# Altium schematic symbol library con-molex.SCHLIB: 369 symbols (part 1 of 6)
Pins are listed as number, name and electrical type; pins without a type are passive.

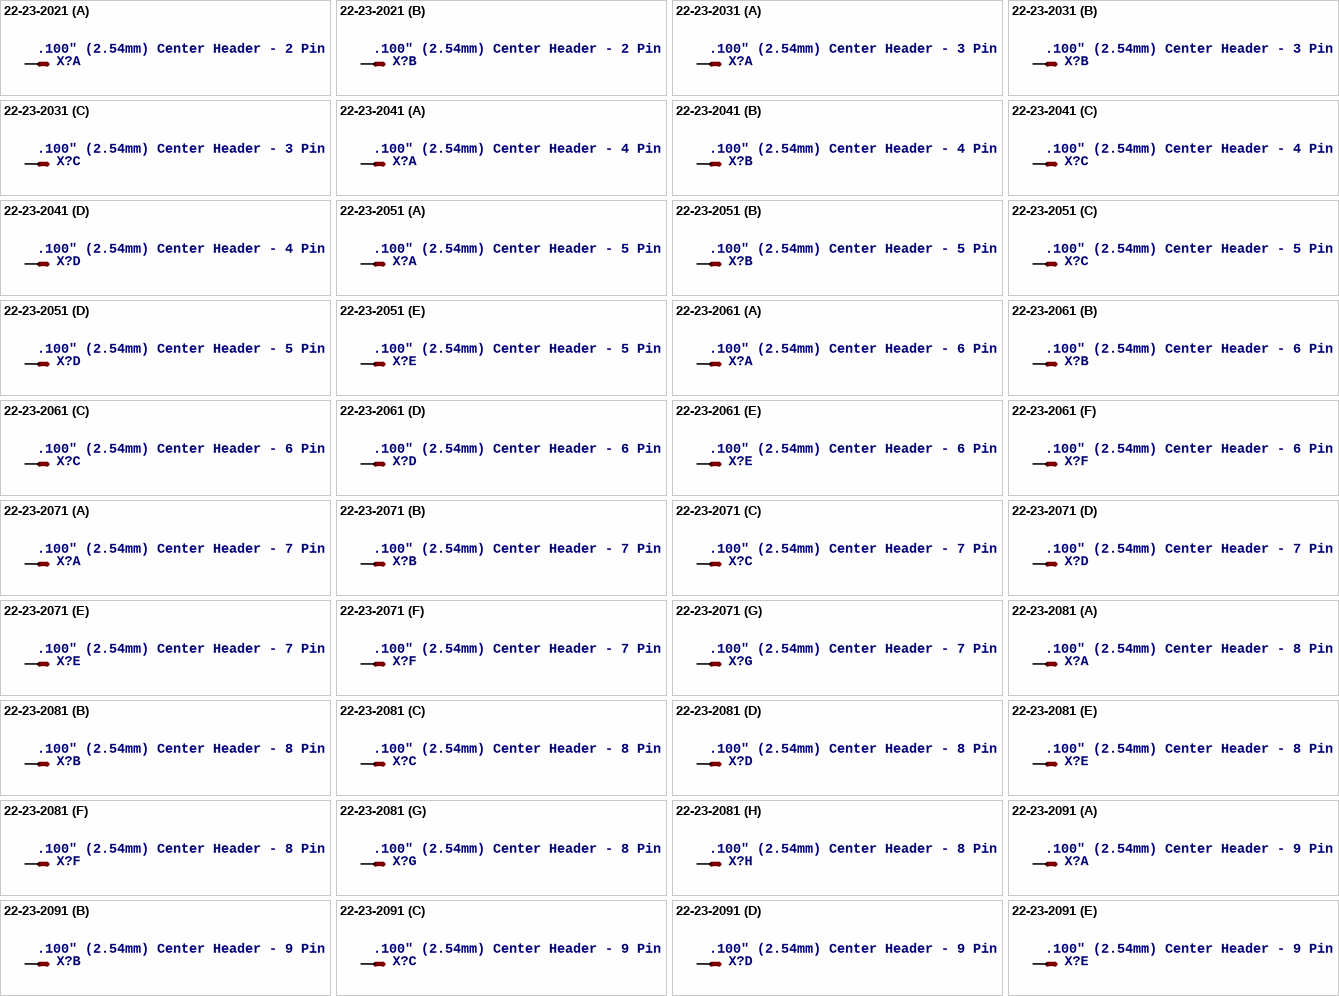
[diagram p0: symbols 22-23-2021 to 22-23-2091]

## 22-23-2021
designator X?, comment .100" (2.54mm) Center Header - 2 Pin
MF: MOLEX; MPN: 22-23-2021; OC_FARNELL: 1462926; OC_NEWARK: 25C3832
footprint 22-23-2021
part A pins: 1 S
part B pins: 2 S

## 22-23-2031
designator X?, comment .100" (2.54mm) Center Header - 3 Pin
MF: MOLEX; MPN: 22-23-2031; OC_FARNELL: 1462950; OC_NEWARK: 30C0862
footprint 22-23-2031
part A pins: 1 S
part B pins: 2 S
part C pins: 3 S

## 22-23-2041
designator X?, comment .100" (2.54mm) Center Header - 4 Pin
MF: MOLEX; MPN: 22-23-2041; OC_FARNELL: 1462920; OC_NEWARK: 38C0355
footprint 22-23-2041
part A pins: 1 S
part B pins: 2 S
part C pins: 3 S
part D pins: 4 S

## 22-23-2051
designator X?, comment .100" (2.54mm) Center Header - 5 Pin
MF: MOLEX; MPN: 22-23-2051; OC_FARNELL: 1462952; OC_NEWARK: 38C9178
footprint 22-23-2051
part A pins: 1 S
part B pins: 2 S
part C pins: 3 S
part D pins: 4 S
part E pins: 5 S

## 22-23-2061
designator X?, comment .100" (2.54mm) Center Header - 6 Pin
MF: MOLEX; MPN: 22-23-2061; OC_FARNELL: 1462922; OC_NEWARK: 27C1933
footprint 22-23-2061
part A pins: 1 S
part B pins: 2 S
part C pins: 3 S
part D pins: 4 S
part E pins: 5 S
part F pins: 6 S

## 22-23-2071
designator X?, comment .100" (2.54mm) Center Header - 7 Pin
MF: MOLEX; MPN: 22-23-2071; OC_FARNELL: 1654534; OC_NEWARK: 56H0445
footprint 22-23-2071
part A pins: 1 S
part B pins: 2 S
part C pins: 3 S
part D pins: 4 S
part E pins: 5 S
part F pins: 6 S
part G pins: 7 S

## 22-23-2081
designator X?, comment .100" (2.54mm) Center Header - 8 Pin
MF: MOLEX; MPN: 22-23-2081; OC_FARNELL: 1756826; OC_NEWARK: 01C7592
footprint 22-23-2081
part A pins: 1 S
part B pins: 2 S
part C pins: 3 S
part D pins: 4 S
part E pins: 5 S
part F pins: 6 S
part G pins: 7 S
part H pins: 8 S

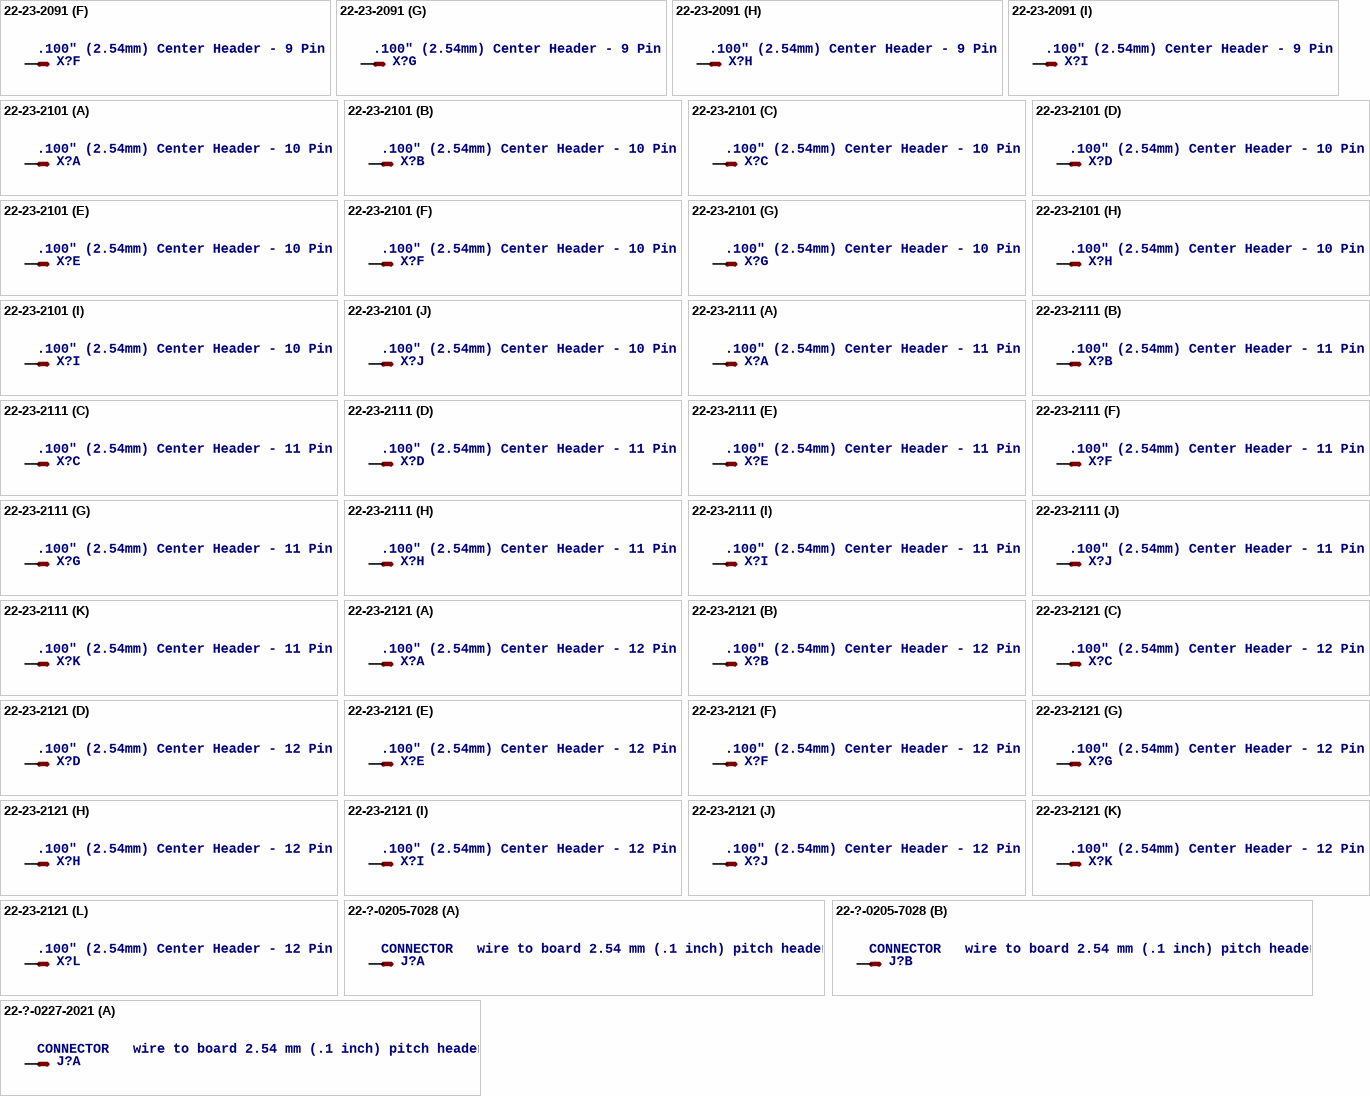
[diagram p1: symbols 22-23-2091 to 22-?-0227-2021]

## 22-23-2091
designator X?, comment .100" (2.54mm) Center Header - 9 Pin
MF: MOLEX; MPN: 22-23-2091; OC_FARNELL: 1756827; OC_NEWARK: 56H0450
footprint 22-23-2091
part A pins: 1 S
part B pins: 2 S
part C pins: 3 S
part D pins: 4 S
part E pins: 5 S
part F pins: 6 S
part G pins: 7 S
part H pins: 8 S
part I pins: 9 S

## 22-23-2101
designator X?, comment .100" (2.54mm) Center Header - 10 Pin
MF: MOLEX; MPN: 22-23-2101; OC_FARNELL: 1756828; OC_NEWARK: 94C0765
footprint 22-23-2101
part A pins: 1 S
part B pins: 2 S
part C pins: 3 S
part D pins: 4 S
part E pins: 5 S
part F pins: 6 S
part G pins: 7 S
part H pins: 8 S
part I pins: 9 S
part J pins: 10 S

## 22-23-2111
designator X?, comment .100" (2.54mm) Center Header - 11 Pin
MF: MOLEX; MPN: 22-23-2111; OC_FARNELL: 5388879; OC_NEWARK: 27C9916
footprint 22-23-2111
part A pins: 1 S
part B pins: 2 S
part C pins: 3 S
part D pins: 4 S
part E pins: 5 S
part F pins: 6 S
part G pins: 7 S
part H pins: 8 S
part I pins: 9 S
part J pins: 10 S
part K pins: 11 S

## 22-23-2121
designator X?, comment .100" (2.54mm) Center Header - 12 Pin
MF: MOLEX; MPN: 22-23-2121; OC_FARNELL: 1462935; OC_NEWARK: 56H0456
footprint 22-23-2121
part A pins: 1 S
part B pins: 2 S
part C pins: 3 S
part D pins: 4 S
part E pins: 5 S
part F pins: 6 S
part G pins: 7 S
part H pins: 8 S
part I pins: 9 S
part J pins: 10 S
part K pins: 11 S
part L pins: 12 S

## 22-?-0205-7028
designator J?, comment CONNECTOR   wire to board 2.54 mm (.1 inch) pitch header
OC_FARNELL: 9731601; OC_NEWARK: unknown
footprint 7395-02
part A pins: 1 S
part B pins: 2 S

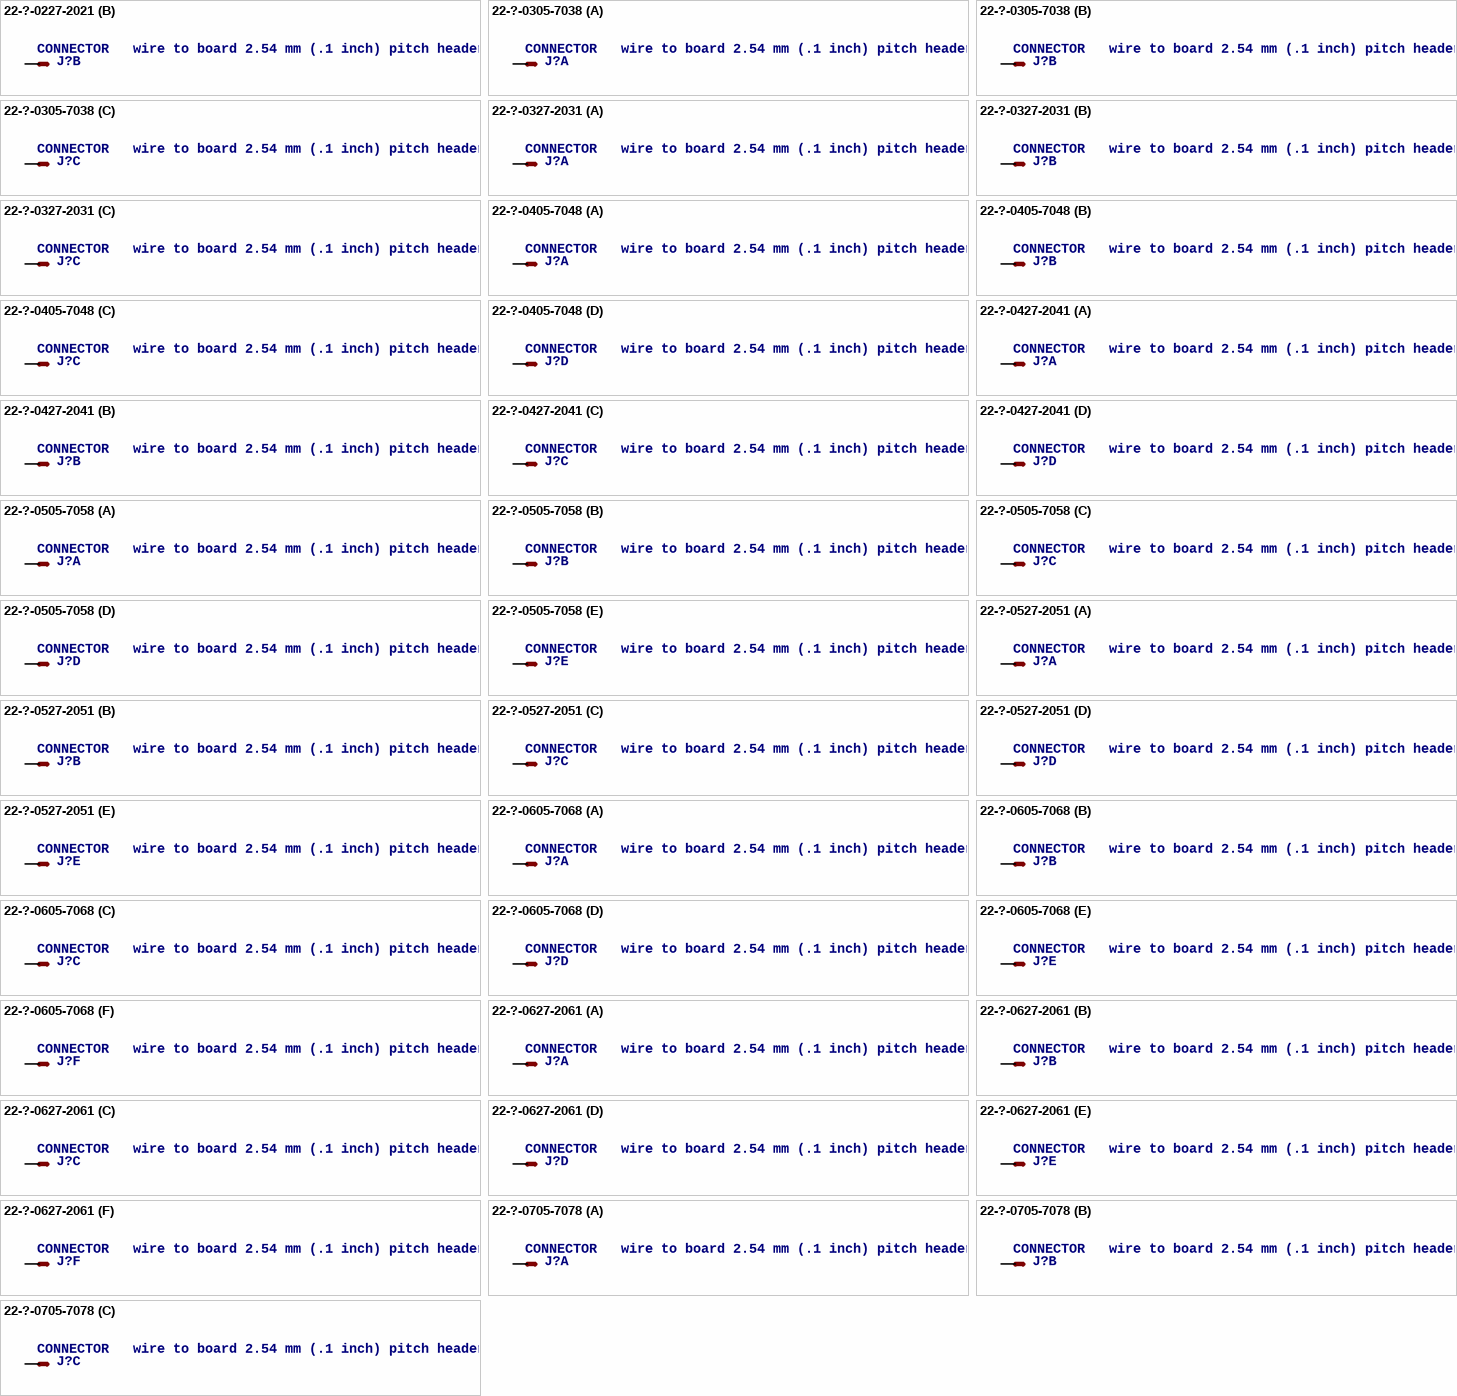
[diagram p2: symbols 22-?-0227-2021 to 22-?-0705-7078]

## 22-?-0227-2021
designator J?, comment CONNECTOR   wire to board 2.54 mm (.1 inch) pitch header
OC_FARNELL: unknown; OC_NEWARK: unknown
footprint 6410-02
part A pins: 1 S
part B pins: 2 S

## 22-?-0305-7038
designator J?, comment CONNECTOR   wire to board 2.54 mm (.1 inch) pitch header
OC_FARNELL: unknown; OC_NEWARK: unknown
footprint 7395-03
part A pins: 1 S
part B pins: 2 S
part C pins: 3 S

## 22-?-0327-2031
designator J?, comment CONNECTOR   wire to board 2.54 mm (.1 inch) pitch header
OC_FARNELL: unknown; OC_NEWARK: unknown
footprint 6410-03
part A pins: 1 S
part B pins: 2 S
part C pins: 3 S

## 22-?-0405-7048
designator J?, comment CONNECTOR   wire to board 2.54 mm (.1 inch) pitch header
OC_FARNELL: unknown; OC_NEWARK: unknown
footprint 7395-04
part A pins: 1 S
part B pins: 2 S
part C pins: 3 S
part D pins: 4 S

## 22-?-0427-2041
designator J?, comment CONNECTOR   wire to board 2.54 mm (.1 inch) pitch header
OC_FARNELL: unknown; OC_NEWARK: unknown
footprint 6410-04
part A pins: 1 S
part B pins: 2 S
part C pins: 3 S
part D pins: 4 S

## 22-?-0505-7058
designator J?, comment CONNECTOR   wire to board 2.54 mm (.1 inch) pitch header
OC_FARNELL: unknown; OC_NEWARK: unknown
footprint 7395-05
part A pins: 1 S
part B pins: 2 S
part C pins: 3 S
part D pins: 4 S
part E pins: 5 S

## 22-?-0527-2051
designator J?, comment CONNECTOR   wire to board 2.54 mm (.1 inch) pitch header
OC_FARNELL: unknown; OC_NEWARK: unknown
footprint 6410-05
part A pins: 1 S
part B pins: 2 S
part C pins: 3 S
part D pins: 4 S
part E pins: 5 S

## 22-?-0605-7068
designator J?, comment CONNECTOR   wire to board 2.54 mm (.1 inch) pitch header
OC_FARNELL: unknown; OC_NEWARK: unknown
footprint 7395-06
part A pins: 1 S
part B pins: 2 S
part C pins: 3 S
part D pins: 4 S
part E pins: 5 S
part F pins: 6 S

## 22-?-0627-2061
designator J?, comment CONNECTOR   wire to board 2.54 mm (.1 inch) pitch header
OC_FARNELL: unknown; OC_NEWARK: unknown
footprint 6410-06
part A pins: 1 S
part B pins: 2 S
part C pins: 3 S
part D pins: 4 S
part E pins: 5 S
part F pins: 6 S

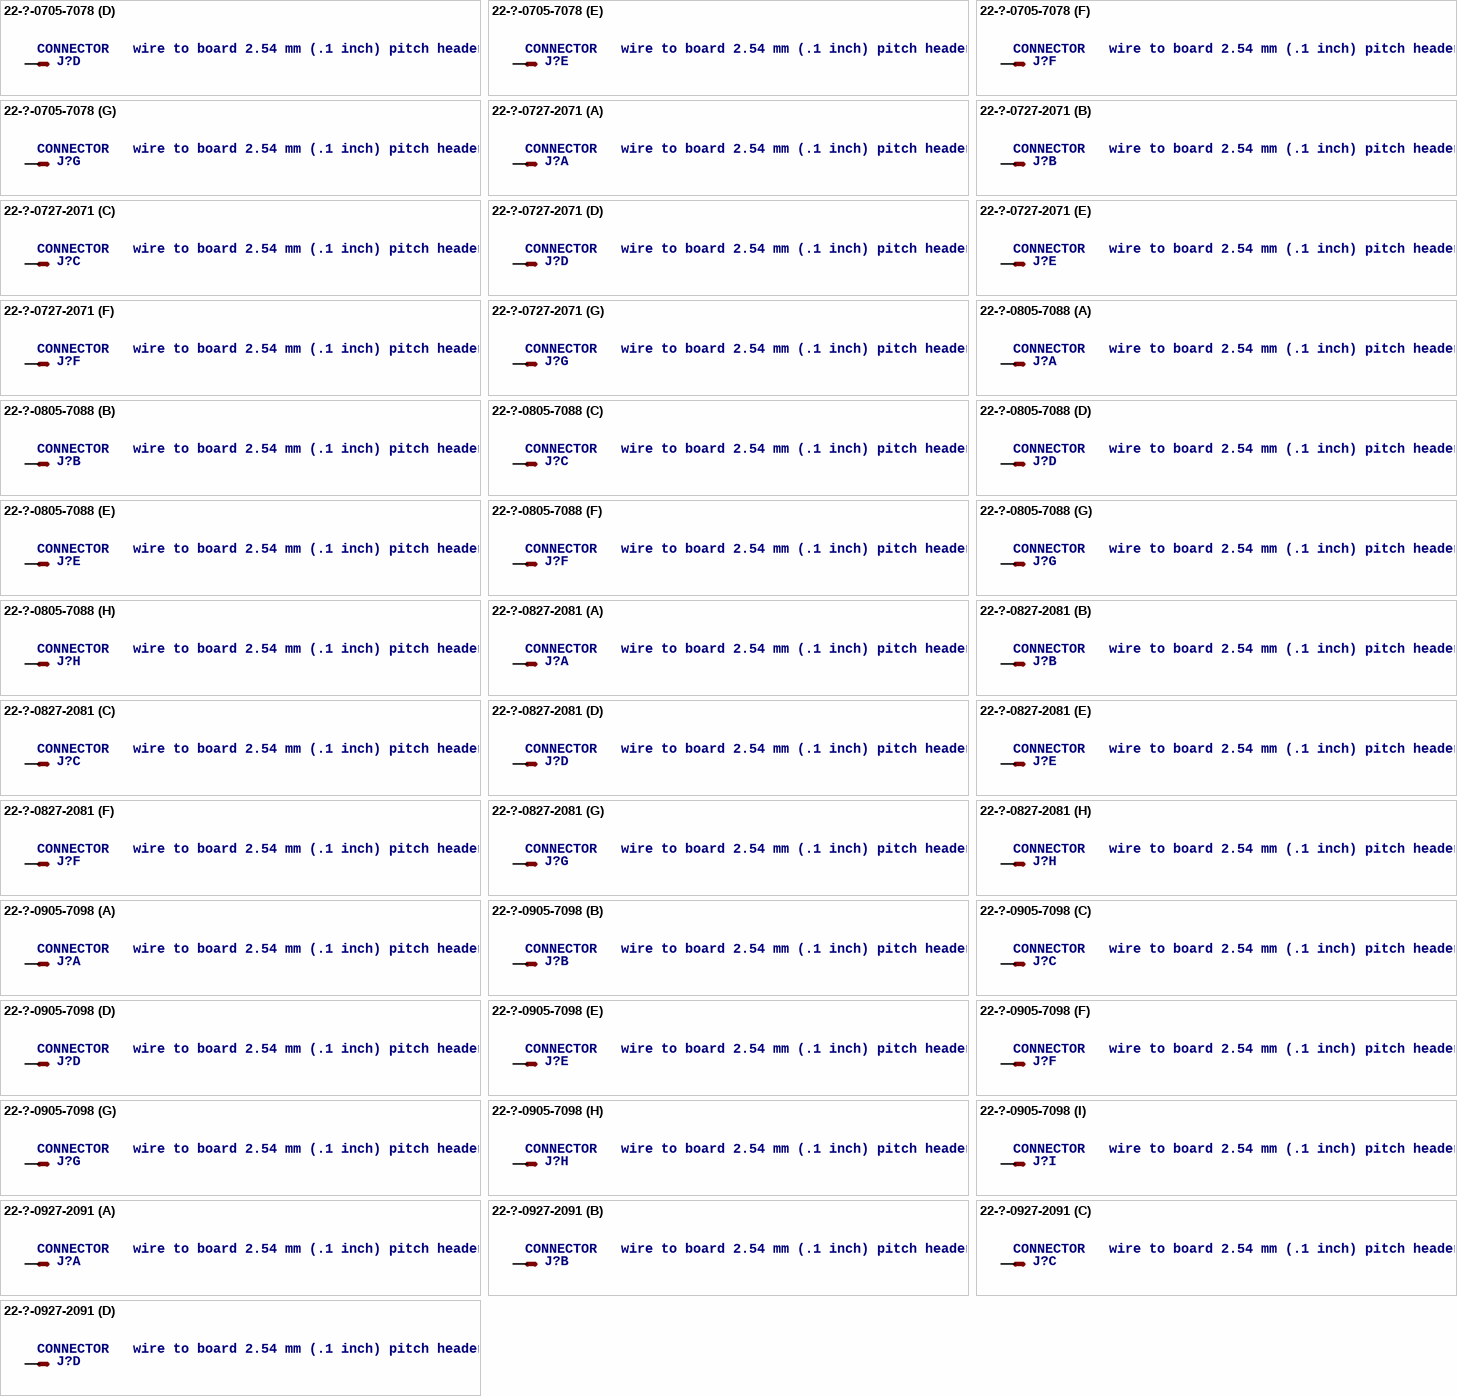
[diagram p3: symbols 22-?-0705-7078 to 22-?-0927-2091]

## 22-?-0705-7078
designator J?, comment CONNECTOR   wire to board 2.54 mm (.1 inch) pitch header
OC_FARNELL: unknown; OC_NEWARK: unknown
footprint 7395-07
part A pins: 1 S
part B pins: 2 S
part C pins: 3 S
part D pins: 4 S
part E pins: 5 S
part F pins: 6 S
part G pins: 7 S

## 22-?-0727-2071
designator J?, comment CONNECTOR   wire to board 2.54 mm (.1 inch) pitch header
OC_FARNELL: unknown; OC_NEWARK: unknown
footprint 6410-07
part A pins: 1 S
part B pins: 2 S
part C pins: 3 S
part D pins: 4 S
part E pins: 5 S
part F pins: 6 S
part G pins: 7 S

## 22-?-0805-7088
designator J?, comment CONNECTOR   wire to board 2.54 mm (.1 inch) pitch header
OC_FARNELL: unknown; OC_NEWARK: unknown
footprint 7395-08
part A pins: 1 S
part B pins: 2 S
part C pins: 3 S
part D pins: 4 S
part E pins: 5 S
part F pins: 6 S
part G pins: 7 S
part H pins: 8 S

## 22-?-0827-2081
designator J?, comment CONNECTOR   wire to board 2.54 mm (.1 inch) pitch header
OC_FARNELL: unknown; OC_NEWARK: unknown
footprint 6410-08
part A pins: 1 S
part B pins: 2 S
part C pins: 3 S
part D pins: 4 S
part E pins: 5 S
part F pins: 6 S
part G pins: 7 S
part H pins: 8 S

## 22-?-0905-7098
designator J?, comment CONNECTOR   wire to board 2.54 mm (.1 inch) pitch header
OC_FARNELL: unknown; OC_NEWARK: unknown
footprint 7395-09
part A pins: 1 S
part B pins: 2 S
part C pins: 3 S
part D pins: 4 S
part E pins: 5 S
part F pins: 6 S
part G pins: 7 S
part H pins: 8 S
part I pins: 9 S

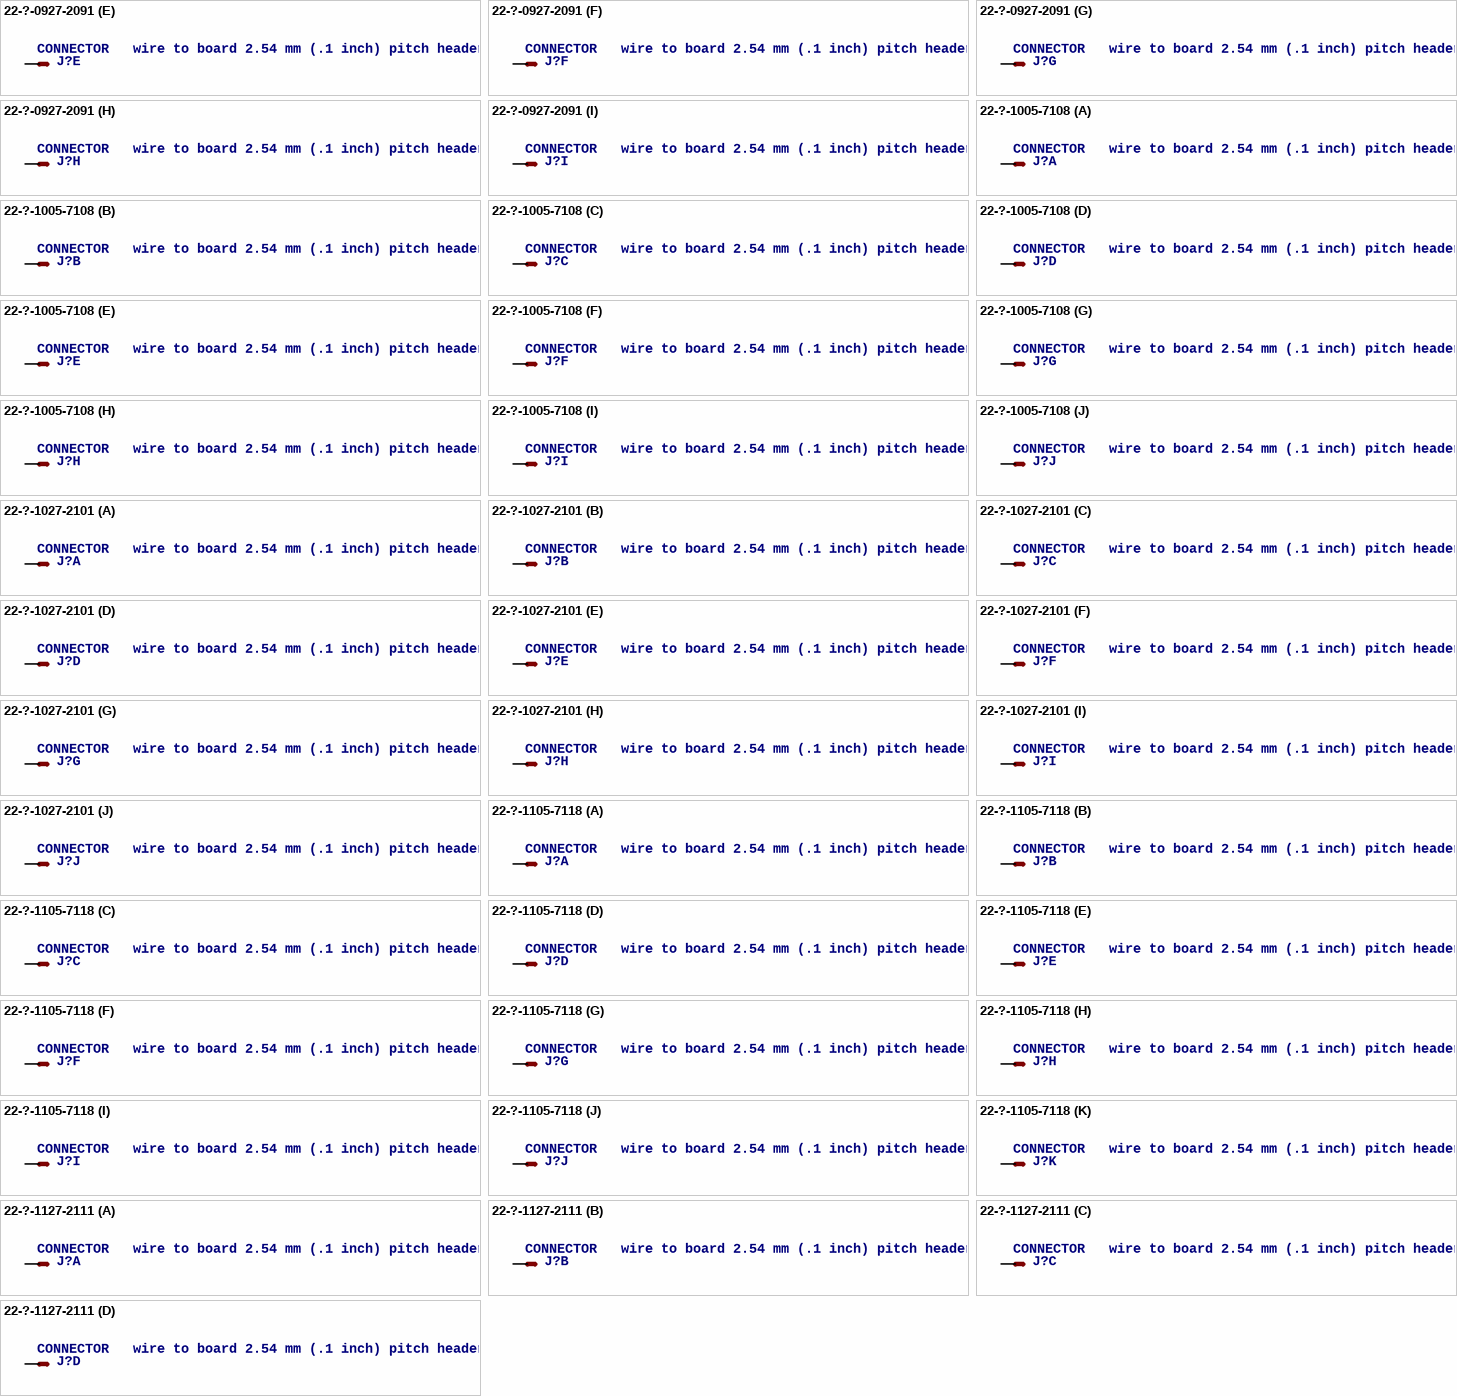
[diagram p4: symbols 22-?-0927-2091 to 22-?-1127-2111]

## 22-?-0927-2091
designator J?, comment CONNECTOR   wire to board 2.54 mm (.1 inch) pitch header
OC_FARNELL: unknown; OC_NEWARK: unknown
footprint 6410-09
part A pins: 1 S
part B pins: 2 S
part C pins: 3 S
part D pins: 4 S
part E pins: 5 S
part F pins: 6 S
part G pins: 7 S
part H pins: 8 S
part I pins: 9 S

## 22-?-1005-7108
designator J?, comment CONNECTOR   wire to board 2.54 mm (.1 inch) pitch header
OC_FARNELL: unknown; OC_NEWARK: unknown
footprint 7395-10
part A pins: 1 S
part B pins: 2 S
part C pins: 3 S
part D pins: 4 S
part E pins: 5 S
part F pins: 6 S
part G pins: 7 S
part H pins: 8 S
part I pins: 9 S
part J pins: 10 S

## 22-?-1027-2101
designator J?, comment CONNECTOR   wire to board 2.54 mm (.1 inch) pitch header
OC_FARNELL: unknown; OC_NEWARK: unknown
footprint 6410-10
part A pins: 1 S
part B pins: 2 S
part C pins: 3 S
part D pins: 4 S
part E pins: 5 S
part F pins: 6 S
part G pins: 7 S
part H pins: 8 S
part I pins: 9 S
part J pins: 10 S

## 22-?-1105-7118
designator J?, comment CONNECTOR   wire to board 2.54 mm (.1 inch) pitch header
OC_FARNELL: unknown; OC_NEWARK: unknown
footprint 7395-11
part A pins: 1 S
part B pins: 2 S
part C pins: 3 S
part D pins: 4 S
part E pins: 5 S
part F pins: 6 S
part G pins: 7 S
part H pins: 8 S
part I pins: 9 S
part J pins: 10 S
part K pins: 11 S

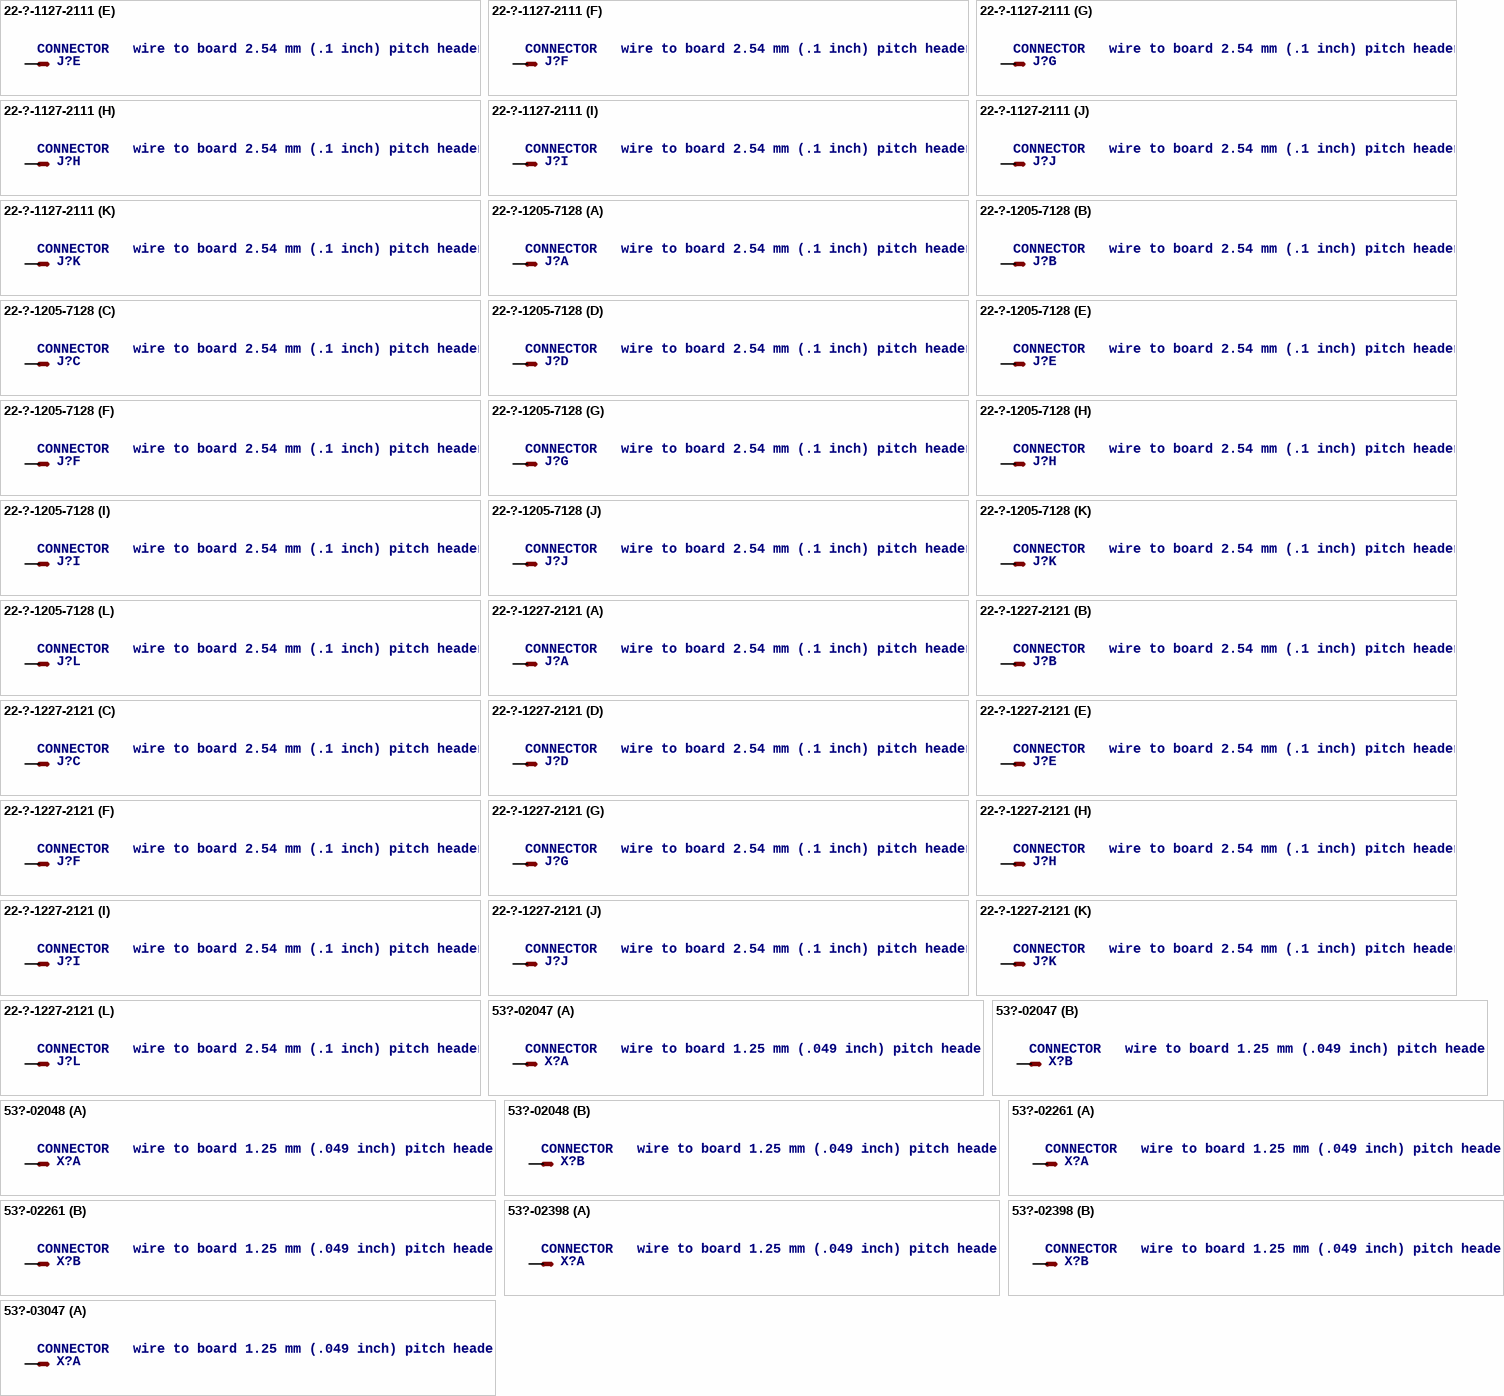
[diagram p5: symbols 22-?-1127-2111 to 53?-03047]

## 22-?-1127-2111
designator J?, comment CONNECTOR   wire to board 2.54 mm (.1 inch) pitch header
OC_FARNELL: unknown; OC_NEWARK: unknown
footprint 6410-11
part A pins: 1 S
part B pins: 2 S
part C pins: 3 S
part D pins: 4 S
part E pins: 5 S
part F pins: 6 S
part G pins: 7 S
part H pins: 8 S
part I pins: 9 S
part J pins: 10 S
part K pins: 11 S

## 22-?-1205-7128
designator J?, comment CONNECTOR   wire to board 2.54 mm (.1 inch) pitch header
OC_FARNELL: unknown; OC_NEWARK: unknown
footprint 7395-12
part A pins: 1 S
part B pins: 2 S
part C pins: 3 S
part D pins: 4 S
part E pins: 5 S
part F pins: 6 S
part G pins: 7 S
part H pins: 8 S
part I pins: 9 S
part J pins: 10 S
part K pins: 11 S
part L pins: 12 S

## 22-?-1227-2121
designator J?, comment CONNECTOR   wire to board 2.54 mm (.1 inch) pitch header
OC_FARNELL: unknown; OC_NEWARK: unknown
footprint 6410-12
part A pins: 1 S
part B pins: 2 S
part C pins: 3 S
part D pins: 4 S
part E pins: 5 S
part F pins: 6 S
part G pins: 7 S
part H pins: 8 S
part I pins: 9 S
part J pins: 10 S
part K pins: 11 S
part L pins: 12 S

## 53?-02047
designator X?, comment CONNECTOR   wire to board 1.25 mm (.049 inch) pitch header
MPN: 53047-0210; MF: MOLEX; OC_FARNELL: 9733051; OC_NEWARK: 57H4701
footprint 53047-02
part A pins: 1 S
part B pins: 2 S

## 53?-02048
designator X?, comment CONNECTOR   wire to board 1.25 mm (.049 inch) pitch header
MPN: 53048-0210; MF: MOLEX; OC_FARNELL: 1012259; OC_NEWARK: 57H4718
footprint 53048-02
part A pins: 1 S
part B pins: 2 S

## 53?-02261
designator X?, comment CONNECTOR   wire to board 1.25 mm (.049 inch) pitch header
OC_FARNELL: 1125373; OC_NEWARK: unknown
footprint 53261-02
part A pins: 1 S
part B pins: 2 S

## 53?-02398
designator X?, comment CONNECTOR   wire to board 1.25 mm (.049 inch) pitch header
OC_FARNELL: unknown; OC_NEWARK: unknown
footprint 53398-02
part A pins: 1 S
part B pins: 2 S

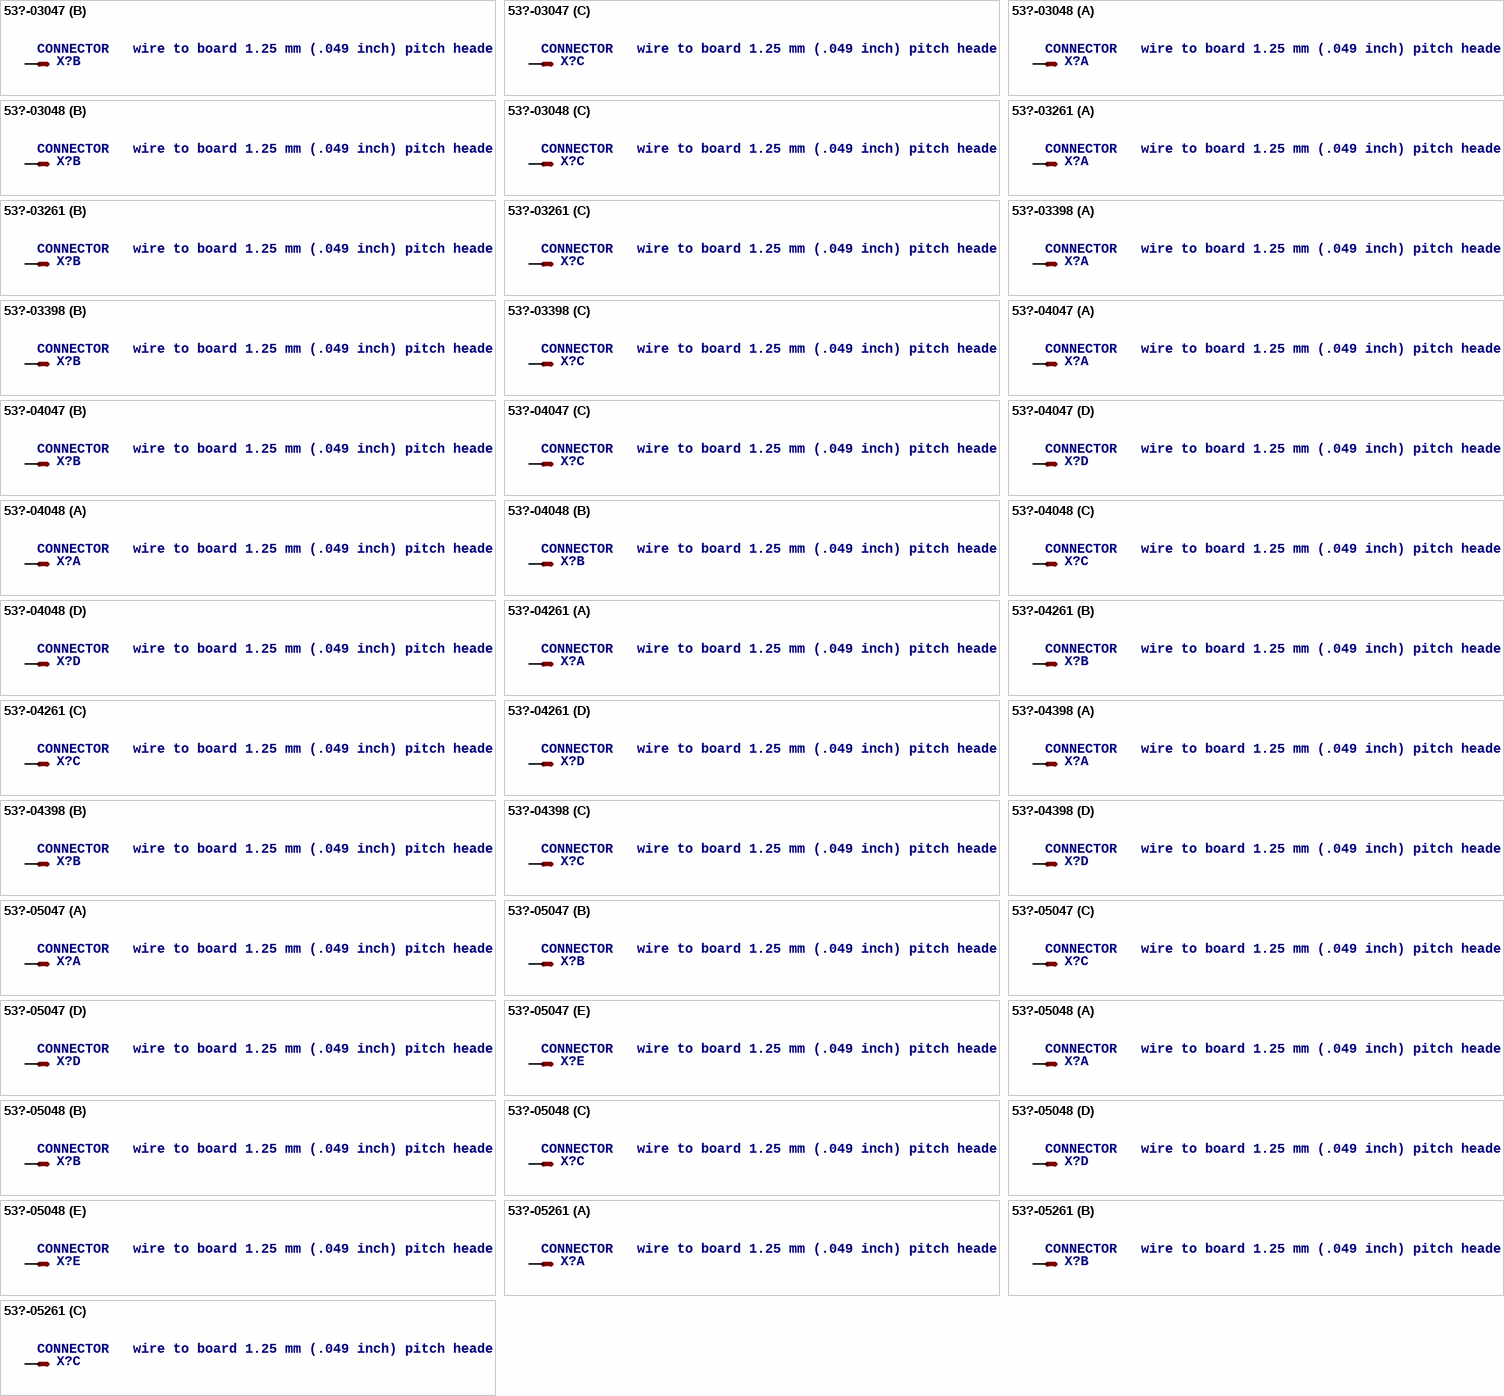
[diagram p6: symbols 53?-03047 to 53?-05261]

## 53?-03047
designator X?, comment CONNECTOR   wire to board 1.25 mm (.049 inch) pitch header
MPN: 530470310; OC_FARNELL: 9732853; OC_NEWARK: 14R5412
footprint 53047-03
part A pins: 1 S
part B pins: 2 S
part C pins: 3 S

## 53?-03048
designator X?, comment CONNECTOR   wire to board 1.25 mm (.049 inch) pitch header
MPN: 53048-0310; MF: WALDOM/MOLEX; OC_FARNELL: 9732918; OC_NEWARK: 38C9908
footprint 53048-03
part A pins: 1 S
part B pins: 2 S
part C pins: 3 S

## 53?-03261
designator X?, comment CONNECTOR   wire to board 1.25 mm (.049 inch) pitch header
MPN: 53261-0390; MF: MOLEX; OC_FARNELL: 1125359; OC_NEWARK: 57H5006
footprint 53261-03
part A pins: 1 S
part B pins: 2 S
part C pins: 3 S

## 53?-03398
designator X?, comment CONNECTOR   wire to board 1.25 mm (.049 inch) pitch header
OC_FARNELL: unknown; OC_NEWARK: unknown
footprint 53398-03
part A pins: 1 S
part B pins: 2 S
part C pins: 3 S

## 53?-04047
designator X?, comment CONNECTOR   wire to board 1.25 mm (.049 inch) pitch header
MPN: 53047-0410; MF: WALDOM/MOLEX; OC_FARNELL: 9733060; OC_NEWARK: 38C9900
footprint 53047-04
part A pins: 1 S
part B pins: 2 S
part C pins: 3 S
part D pins: 4 S

## 53?-04048
designator X?, comment CONNECTOR   wire to board 1.25 mm (.049 inch) pitch header
MPN: 53048-0410; MF: MOLEX; OC_FARNELL: 1462887; OC_NEWARK: 57H4721
footprint 53048-04
part A pins: 1 S
part B pins: 2 S
part C pins: 3 S
part D pins: 4 S

## 53?-04261
designator X?, comment CONNECTOR   wire to board 1.25 mm (.049 inch) pitch header
OC_FARNELL: 1125374; OC_NEWARK: unknown
footprint 53261-04
part A pins: 1 S
part B pins: 2 S
part C pins: 3 S
part D pins: 4 S

## 53?-04398
designator X?, comment CONNECTOR   wire to board 1.25 mm (.049 inch) pitch header
OC_FARNELL: 1125367; OC_NEWARK: unknown
footprint 53398-04
part A pins: 1 S
part B pins: 2 S
part C pins: 3 S
part D pins: 4 S

## 53?-05047
designator X?, comment CONNECTOR   wire to board 1.25 mm (.049 inch) pitch header
MPN: 53047-0510; MF: MOLEX; OC_FARNELL: 9732861; OC_NEWARK: 38C9901
footprint 53047-05
part A pins: 1 S
part B pins: 2 S
part C pins: 3 S
part D pins: 4 S
part E pins: 5 S

## 53?-05048
designator X?, comment CONNECTOR   wire to board 1.25 mm (.049 inch) pitch header
MPN: 53048-0510; MF: MOLEX; OC_FARNELL: 9732926; OC_NEWARK: 57H4722
footprint 53048-05
part A pins: 1 S
part B pins: 2 S
part C pins: 3 S
part D pins: 4 S
part E pins: 5 S
